# Altium schematic symbol library Schlib.SchLib: 725 symbols (part 1 of 6) (continued)
## 43025-0400 (continued)

## 47053-1000
designator J?  (value not drawn)
CONN HEADER VERT 4POS 2.54MM; Manufacturer: Molex; Manufacturer Part Number: 47053-1000; Number of Contacts: 4; Current Rating: 4A; Voltage Rating: 250V; Gender: Male; Glow Wire Compliant: Non-compliant; Supplier: Rs; Supplier Part Number: 1448185; RoHS: Yes; Category: Headers and Wire Housings; Stock: 1020; Pricing: 10=0.41500, 100=0.38900, 200=0.36400, 250=0.33800, 500=0.31200 (GBP); Mounting Technology: Through Hole; Contact Plating: Tin; Contact Material: Brass,Copper; Housing Color: Beige; Housing Material: Nylon; Min Operating Temperature: 0°C; Max Operating Temperature: 75°C; Termination: Through Hole; Number of Rows: 1; Packaging: Bulk; Package Quantity: 12000; Number of Positions: 4; Orientation: Vertical; Voltage Rating (DC): 250V; Number of Circuits: 4; Series: 47053; Length: 10.2mm; Pitch: 2.54mm; Depth: 5.84mm; Radiation Hardening: No; RoHS Compliant: Yes; Halogen Free: Low Halogen; ComponentLink1URL: https://datasheet.ciiva.com/22683/1701278-22683428.pdf?src-supplier=Element14; ComponentLink1Description: https://datasheet.ciiva.com/22683/1701278-22683428.pdf?src-supplier=Element14; ComponentLink2URL: https://datasheet.ciiva.com/30226/191140470531000-pcb-headers-30226282.pdf?src-supplier=Onlinecomponents.com; ComponentLink2Description: https://datasheet.ciiva.com/30226/191140470531000-pcb-headers-30226282.pdf?src-supplier=Onlinecomponents.com; ComponentLink3URL: https://datasheet.ciiva.com/5153/0470531000-pcb-headers-146351-5153461.pdf?src-supplier=Mouser; ComponentLink3Description: https://datasheet.ciiva.com/5153/0470531000-pcb-headers-146351-5153461.pdf?src-supplier=Mouser; ComponentLink4URL: https://datasheet.ciiva.com/10090/0470531000-pcb-headers-10090525.pdf?src-supplier=Avnet; ComponentLink4Description: https://datasheet.ciiva.com/10090/0470531000-pcb-headers-10090525.pdf?src-supplier=Avnet
footprint 47053-1000
pins: 1, 2, 3, 4

## 52435-2271
designator J?  (value not drawn)
Conn FFC/FPC Connector SKT 22 POS 0.5mm Solder RA SMD Easy-On™ T/R; Manufacturer: Molex; Manufacturer Part Number: 52435-2271; Supplier: Mouser; Supplier Part Number: 538-52435-2271; RoHS: Yes; Category: FFC / FPC; Stock: 4465; Pricing: 1=1.19, 10=1.19, 50=1.19, 100=1.19, 1000=1.19, 10000=1.19 (USD); ComponentLink1URL: https://datasheet.ciiva.com/16120/407840524352271-ffc-fpc-nectors-16120305.pdf?src-supplier=Onlinecomponents.com; ComponentLink1Description: https://datasheet.ciiva.com/16120/407840524352271-ffc-fpc-nectors-16120305.pdf?src-supplier=Onlinecomponents.com; ComponentLink2URL: https://datasheet.ciiva.com/30091/383140524352271-ffc-fpc-nectors-30091502.pdf?src-supplier=Onlinecomponents.com; ComponentLink2Description: https://datasheet.ciiva.com/30091/383140524352271-ffc-fpc-nectors-30091502.pdf?src-supplier=Onlinecomponents.com; ComponentLink3URL: https://datasheet.ciiva.com/5137/0524352271-ffc-fpc-connectors-170492-5137771.pdf?src-supplier=Mouser; ComponentLink3Description: https://datasheet.ciiva.com/5137/0524352271-ffc-fpc-connectors-170492-5137771.pdf?src-supplier=Mouser; ComponentLink4URL: https://datasheet.ciiva.com/16659/0524352271-ffc-fpc-connectors-16659956.pdf?; ComponentLink4Description: https://datasheet.ciiva.com/16659/0524352271-ffc-fpc-connectors-16659956.pdf?; ComponentLink5URL: https://datasheet.ciiva.com/10366/0524352271-ffc-fpc-connectors-10366757.pdf?src-supplier=Avnet; ComponentLink5Description: https://datasheet.ciiva.com/10366/0524352271-ffc-fpc-connectors-10366757.pdf?src-supplier=Avnet
footprint 524352271
pins: 1, 2, 3, 4, 5, 6, 7, 8, 9, 10, 11, 12, 13, 14, 15, 16, 17, 18, 19, 20, 21, 22, MP1, MP2, MP3, MP4

## 52559-2253
designator *
FFC / FPC Board Connector, 0.5 mm, 22 Contacts, Receptacle, Easy-On 52559 Series, Surface Mount; Manufacturer: Molex; Manufacturer Part Number: 52559-2253; Manufacturer Lifecycle Status: ACTIVE; Actuator Material: Polyphenylene; Contact Resistance: 20mΩ; Current Rating: 500mA; Dielectric Material: Polyamide; Insulation Resistance: 50MΩ; Number of Circuits: 22; Pitch: 1mm; Plating: Tin; Plating Thickness: 101.6nm; Voltage Rating: 50V; Wire/Cable Type: Straight; Supplier: Arrow Electronics; Supplier Part Number: 0525592253; RoHS: Compliant; Category: Card Edge Connectors; Stock: 6000; Pricing: 1000=1.6023, 2000=1.52, 3000=1.468, 5000=1.408 (USD); China RoHS: Compliant; Contact Gender: Female; Contact Material: Bronze; Contact Plating: Gold; Country of Origin: MY; Depth: 3mm; Flammability Rating: UL94 V-0; Housing Color: Natural; Housing Material: Nylon; Length: 16.7mm; Lifecycle Status: Production; Max Operating Temperature: 85°C; Min Operating Temperature: -20°C; Mounting Technology: Surface Mount; Number of Contacts: 22; Pins: 22; Number of Positions: 22; Number of Rows: 1; Orientation: Vertical; Radiation Hardening: No; REACH SVHC: Yes; Schedule B: 8536694040, 8536694040|8536694040, 8536694040|8536694040|8536694040, 8536694040|8536694040|8536694040|8536694040; Terminal Pitch: 500µm; Termination: Solder; ComponentLink1URL: https://datasheet.octopart.com:443/52559-2253-Molex-datasheet-164834097.pdf?src-supplier=Farnell; ComponentLink1Description: https://datasheet.octopart.com:443/52559-2253-Molex-datasheet-164834097.pdf?src-supplier=Farnell; ComponentLink2URL: https://datasheet.octopart.com:443/52559-2253-Molex-datasheet-13777103.pdf?src-supplier=Molex; ComponentLink2Description: https://datasheet.octopart.com:443/52559-2253-Molex-datasheet-13777103.pdf?src-supplier=Molex; ComponentLink3URL: https://sigma.octopart.com:443/32997597/technical_drawing/Molex-525592253.pdf?src-supplier=Molex; ComponentLink3Description: https://sigma.octopart.com:443/32997597/technical_drawing/Molex-525592253.pdf?src-supplier=Molex; ComponentLink4URL: https://datasheet.octopart.com:443/52559-2253-Molex-datasheet-140186331.pdf?src-supplier=RS+(Formerly+Allied+Electronics); ComponentLink4Description: https://datasheet.octopart.com:443/52559-2253-Molex-datasheet-140186331.pdf?src-supplier=RS+(Formerly+Allied+Electronics); ComponentLink5URL: https://datasheet.octopart.com:443/52559-2253-Molex-datasheet-120153440.pdf?src-supplier=RS+(Formerly+Allied+Electronics); ComponentLink5Description: https://datasheet.octopart.com:443/52559-2253-Molex-datasheet-120153440.pdf?src-supplier=RS+(Formerly+Allied+Electronics); ComponentLink6URL: https://datasheet.octopart.com:443/0525592253-Molex-datasheet-11736640.pdf?src-supplier=Arrow+Electronics; ComponentLink6Description: https://datasheet.octopart.com:443/0525592253-Molex-datasheet-11736640.pdf?src-supplier=Arrow+Electronics; ComponentLink7URL: http://sigma.octopart.com:80/32997640/rohs_statement/Molex-525592253.pdf?src-supplier=Compliance+Statements; ComponentLink7Description: http://sigma.octopart.com:80/32997640/rohs_statement/Molex-525592253.pdf?src-supplier=Compliance+Statements; ComponentLink8URL: http://sigma.octopart.com:80/conflict_mineral_statement/Molex-company-72.pdf?src-supplier=Compliance+Statements; ComponentLink8Description: http://sigma.octopart.com:80/conflict_mineral_statement/Molex-company-72.pdf?src-supplier=Compliance+Statements; ComponentLink9URL: http://sigma.octopart.com:80/rohs_statement/Molex-company-73.pdf?src-supplier=Compliance+Statements; ComponentLink9Description: http://sigma.octopart.com:80/rohs_statement/Molex-company-73.pdf?src-supplier=Compliance+Statements; ComponentLink10URL: http://sigma.octopart.com:80/reach_statement/Molex-company-74.pdf?src-supplier=Compliance+Statements; ComponentLink10Description: http://sigma.octopart.com:80/reach_statement/Molex-company-74.pdf?src-supplier=Compliance+Statements
pins: 1, 2, 3, 4, 5, 6, 7, 8, 9, 10, 11, 12, 13, 14, 15, 16, 17, 18, 19, 20, 21, 22, MP1, MP2, MP3, MP4

## 53047-0210
designator J?  (value not drawn)
PicoBlade 53047 2-Position Shrouded Header Male Blade 0.049" (1.25mm) Natural Through Hole; Manufacturer: Molex; Manufacturer Part Number: 53047-0210; Body Plating: Tin; Plating: 154ConductorMaterial; Contact Resistance: 20mR; Current Rating: 1A; Voltage Rating: 125V; Number of Poles: 2; Max Current Rating: 3A; Insulation Resistance: 100MR; Glow Wire Compliant: Non-compliant; Supplier: Mouser; Supplier Part Number: 538-53047-0210; RoHS: Yes; Category: Headers and Wire Housings; Stock: 27749; Pricing: 1=0.17, 10=0.111, 50=0.111, 100=0.094, 1000=0.088, 10000=0.075 (USD); Mounting Technology: Through Hole; Contact Plating: Tin,Gold; Contact Material: Bronze,Brass,Tin; Housing Color: Black; Color: Natural; Housing Material: Polyamide; Min Operating Temperature: -40°C; Max Operating Temperature: 85°C; Number of Rows: 1; Voltage Rating (AC): 125V; Packaging: Tray; Package Quantity: 5000; Number of Positions: 2; Termination: Solder; Number of Contacts: 2; Working Voltage: 125V; Orientation: Vertical; Gender: Male; Number of Circuits: 2; Series: PicoBlade; Length: 71.1mm; Height: 11.43mm; Lead Pitch: 1.25mm; Pitch: 1.25mm; Depth: 6.6mm; Radiation Hardening: No; Lead Free: Lead Free; Flammability Rating: UL94 V-0; RoHS Compliant: Yes; Reach SVHC Compliant: Unknown
footprint 0530470210
pins: 1, 2

## 54548-2272
designator *
Cross Referenced to MOLEX - Part MOL0545482272; Manufacturer Part Number: 54548-2272; Supplier: Mouser; Supplier Part Number: 538-54548-2272; Manufacturer: Molex; RoHS: No; Category: Connectors; Stock: 17751; Pricing: 1=3.46, 10=3.04, 50=3.04, 100=2.42, 1000=2, 10000=1.87 (USD)
pins: 1, 2, 3, 4, 5, 6, 7, 8, 9, 10, 11, 12, 13, 14, 15, 16, 17, 18, 19, 20, 21, 22, MP1, MP2, MP3, MP4

## 55917-0810
designator J?  (value not drawn)
2.00mm Pitch MicroClasp Wire-to-Board Header, Dual Row, Vertical, 8 Circuits, with PCB Locator; Manufacturer: Molex; Manufacturer Part Number: 55917-0810; Manufacturer Lifecycle Status: ACTIVE; Contact Resistance: 20mΩ; Current Rating: 300mA; Gender: Male; Glow Wire Compliant: Non-compliant; Insulation Resistance: 1GΩ; Max Current Rating: 3A; Max Voltage Rating (DC): 250.25kV; Number of Circuits: 8; Operating Force: 4.8928N; Pitch: 2mm; Plating: Tin; Row Spacing: 5.0038mm; Voltage Rating: 250V; Supplier: RS; Supplier Part Number: 406449; RoHS: Compliant; Category: Headers and Wire Housings; Stock: 910; Pricing: 10=0.37 (GBP); Ambient Temperature Range High: 105°C; China RoHS: Compliant; Color: Natural, White; Contact Gender: Male; Contact Material: Brass; Contact Plating: Tin; Country of Origin: VN; Flammability Rating: UL94 V-0; Height: 9.95mm; Housing Material: Polyester; Lead Pitch: 2mm; Lifecycle Status: Production; Material: Glass, Polyester; Max Operating Temperature: 85°C; Min Operating Temperature: -25°C; Mounting Technology: Through Hole; Number of Contacts: 8; Pins: 8; Number of Poles: 8; Number of Positions: 8; Number of Rows: 2; Orientation: Vertical; Packaging: Bulk; REACH SVHC: Yes; Schedule B: 8536694040, 8536694040|8536694040|8536694040|8536694040|8536694040|8536694040|8536694040|8536694040|8536694040|8536694040|8536694040|8536694040|8536694040|8536694040|8536694040|8536694040|8536694040|8536694040|8536694040|8536694040|8536694040|8536694040|8536694040|85; Terminal Pitch: 2mm; Termination: Solder; Voltage Rating (AC): 250V; Voltage Rating (DC): 250V; Working Voltage: 250V; ComponentLink1URL: https://sigma.octopart.com:443/164493888/technical_drawing/Molex-55917-0810.pdf?src-supplier=IHS; ComponentLink1Description: https://sigma.octopart.com:443/164493888/technical_drawing/Molex-55917-0810.pdf?src-supplier=IHS; ComponentLink2URL: https://datasheet.octopart.com:443/55917-0810-Molex-datasheet-164493884.pdf?src-supplier=Upverter; ComponentLink2Description: https://datasheet.octopart.com:443/55917-0810-Molex-datasheet-164493884.pdf?src-supplier=Upverter; ComponentLink3URL: https://datasheet.octopart.com:443/55917-0810-Molex-datasheet-16420540.pdf?src-supplier=Sager+Electronics; ComponentLink3Description: https://datasheet.octopart.com:443/55917-0810-Molex-datasheet-16420540.pdf?src-supplier=Sager+Electronics; ComponentLink4URL: https://datasheet.octopart.com:443/0559170810-Molex-datasheet-158457239.pdf?src-supplier=Sager+Electronics; ComponentLink4Description: https://datasheet.octopart.com:443/0559170810-Molex-datasheet-158457239.pdf?src-supplier=Sager+Electronics; ComponentLink5URL: https://sigma.octopart.com:443/11018036/technical_drawing/Molex-55917-0810.pdf?src-supplier=Molex; ComponentLink5Description: https://sigma.octopart.com:443/11018036/technical_drawing/Molex-55917-0810.pdf?src-supplier=Molex; ComponentLink6URL: https://datasheet.octopart.com:443/559170810-Molex-datasheet-8341728.pdf?src-supplier=Molex; ComponentLink6Description: https://datasheet.octopart.com:443/559170810-Molex-datasheet-8341728.pdf?src-supplier=Molex; ComponentLink7URL: https://datasheet.octopart.com:443/55917-0810-Molex-datasheet-154756755.pdf?src-supplier=Master+Electronics; ComponentLink7Description: https://datasheet.octopart.com:443/55917-0810-Molex-datasheet-154756755.pdf?src-supplier=Master+Electronics; ComponentLink8URL: https://datasheet.octopart.com:443/55917-0810-Molex-datasheet-41568811.pdf?src-supplier=Electro+Sonic; ComponentLink8Description: https://datasheet.octopart.com:443/55917-0810-Molex-datasheet-41568811.pdf?src-supplier=Electro+Sonic; ComponentLink9URL: https://datasheet.octopart.com:443/55917-0810-Molex-datasheet-37171827.pdf?src-supplier=Electro+Sonic; ComponentLink9Description: https://datasheet.octopart.com:443/55917-0810-Molex-datasheet-37171827.pdf?src-supplier=Electro+Sonic; ComponentLink10URL: https://datasheet.octopart.com:443/55917-0810-Molex-datasheet-23710648.pdf?src-supplier=Electro+Sonic; ComponentLink10Description: https://datasheet.octopart.com:443/55917-0810-Molex-datasheet-23710648.pdf?src-supplier=Electro+Sonic; ComponentLink11URL: https://datasheet.octopart.com:443/55917-0810-Molex-datasheet-168217160.pdf?src-supplier=TME; ComponentLink11Description: https://datasheet.octopart.com:443/55917-0810-Molex-datasheet-168217160.pdf?src-supplier=TME; ComponentLink12URL: https://datasheet.octopart.com:443/55917-0810-Molex-datasheet-140186835.pdf?src-supplier=RS+(Formerly+Allied+Electronics); ComponentLink12Description: https://datasheet.octopart.com:443/55917-0810-Molex-datasheet-140186835.pdf?src-supplier=RS+(Formerly+Allied+Electronics); ComponentLink13URL: https://datasheet.octopart.com:443/55917-0810-Molex-datasheet-120154482.pdf?src-supplier=RS+(Formerly+Allied+Electronics); ComponentLink13Description: https://datasheet.octopart.com:443/55917-0810-Molex-datasheet-120154482.pdf?src-supplier=RS+(Formerly+Allied+Electronics); ComponentLink14URL: https://datasheet.octopart.com:443/55917-0810-Molex-datasheet-112141758.pdf?src-supplier=Newark; ComponentLink14Description: https://datasheet.octopart.com:443/55917-0810-Molex-datasheet-112141758.pdf?src-supplier=Newark; ComponentLink15URL: https://datasheet.octopart.com:443/55917-0810-Molex-datasheet-77523450.pdf?src-supplier=Newark; ComponentLink15Description: https://datasheet.octopart.com:443/55917-0810-Molex-datasheet-77523450.pdf?src-supplier=Newark; ComponentLink16URL: https://datasheet.octopart.com:443/55917-0810-Molex-datasheet-33003963.pdf?src-supplier=Newark; ComponentLink16Description: https://datasheet.octopart.com:443/55917-0810-Molex-datasheet-33003963.pdf?src-supplier=Newark; ComponentLink17URL: https://datasheet.octopart.com:443/55917-0810-Molex-datasheet-27773.pdf?src-supplier=Newark; ComponentLink17Description: https://datasheet.octopart.com:443/55917-0810-Molex-datasheet-27773.pdf?src-supplier=Newark; ComponentLink18URL: https://datasheet.octopart.com:443/55917-0810-Molex-datasheet-167409.pdf?src-supplier=Mouser; ComponentLink18Description: https://datasheet.octopart.com:443/55917-0810-Molex-datasheet-167409.pdf?src-supplier=Mouser; ComponentLink19URL: https://datasheet.octopart.com:443/559170810-Molex-datasheet-506651.pdf?src-supplier=Farnell; ComponentLink19Description: https://datasheet.octopart.com:443/559170810-Molex-datasheet-506651.pdf?src-supplier=Farnell; ComponentLink20URL: http://sigma.octopart.com:80/16420541/rohs_statement/Molex-55917-0810.pdf?src-supplier=Compliance+Statements; ComponentLink20Description: http://sigma.octopart.com:80/16420541/rohs_statement/Molex-55917-0810.pdf?src-supplier=Compliance+Statements; ComponentLink21URL: http://sigma.octopart.com:80/conflict_mineral_statement/Molex-company-72.pdf?src-supplier=Compliance+Statements; ComponentLink21Description: http://sigma.octopart.com:80/conflict_mineral_statement/Molex-company-72.pdf?src-supplier=Compliance+Statements; ComponentLink22URL: http://sigma.octopart.com:80/rohs_statement/Molex-company-73.pdf?src-supplier=Compliance+Statements; ComponentLink22Description: http://sigma.octopart.com:80/rohs_statement/Molex-company-73.pdf?src-supplier=Compliance+Statements; ComponentLink23URL: http://sigma.octopart.com:80/reach_statement/Molex-company-74.pdf?src-supplier=Compliance+Statements; ComponentLink23Description: http://sigma.octopart.com:80/reach_statement/Molex-company-74.pdf?src-supplier=Compliance+Statements
footprint 0559170810
pins: 1, 2, 3, 4, 5, 6, 7, 8

## 55917-1010
designator J?  (value not drawn)
2.00mm Pitch MicroClasp Wire-to-Board Header, Dual Row, Vertical, 10 Circuits, with PCB Locator; Manufacturer: Molex; Manufacturer Part Number: 55917-1010; Manufacturer Lifecycle Status: ACTIVE; Contact Resistance: 20mΩ; Current Rating: 3A; Gender: Male; Glow Wire Compliant: Non-compliant; Insulation Resistance: 1GΩ; Max Voltage Rating (DC): 250.25kV; Number of Circuits: 8; Number of Contacts: 10; Operating Force: 4.448N; Pitch: 2mm; Plating: Tin; Row Spacing: 5.0038mm; Voltage Rating: 250V; Supplier: RS; Supplier Part Number: 406439P; RoHS: Compliant; Category: Headers and Wire Housings; Stock: 2313; Pricing: 10=0.249 (GBP); China RoHS: Compliant; Color: Natural, White; Contact Gender: Male; Contact Material: Nickel, Tin; Contact Plating: Tin; Country of Origin: VN; Flammability Rating: UL94 V-0; Height: 9.95mm; Housing Material: Polyester; Lead Pitch: 2mm; Lifecycle Status: Production; Material: Glass, Polyester; Max Current Rating: 3A; Max Operating Temperature: 85°C; Min Operating Temperature: -25°C; Mounting Technology: Through Hole; Pins: 10; Number of Poles: 10; Number of Positions: 10; Number of Rows: 2; Orientation: Vertical; Packaging: Bulk; Radiation Hardening: No; REACH SVHC: Yes; Terminal Pitch: 2mm; Termination: Solder; Voltage Rating (AC): 250V; Voltage Rating (DC): 250V; Working Voltage: 250V; ComponentLink1URL: https://datasheet.octopart.com:443/55917-1010-Molex-datasheet-163792276.pdf?src-supplier=Upverter; ComponentLink1Description: https://datasheet.octopart.com:443/55917-1010-Molex-datasheet-163792276.pdf?src-supplier=Upverter; ComponentLink2URL: https://sigma.octopart.com:443/163792277/technical_drawing/Molex-55917-1010.pdf?src-supplier=Upverter; ComponentLink2Description: https://sigma.octopart.com:443/163792277/technical_drawing/Molex-55917-1010.pdf?src-supplier=Upverter; ComponentLink3URL: https://datasheet.octopart.com:443/55917-1010-Molex-datasheet-180777589.pdf?src-supplier=IHS; ComponentLink3Description: https://datasheet.octopart.com:443/55917-1010-Molex-datasheet-180777589.pdf?src-supplier=IHS; ComponentLink4URL: https://datasheet.octopart.com:443/55917-1010-Molex-datasheet-16420545.pdf?src-supplier=Sager+Electronics; ComponentLink4Description: https://datasheet.octopart.com:443/55917-1010-Molex-datasheet-16420545.pdf?src-supplier=Sager+Electronics; ComponentLink5URL: https://datasheet.octopart.com:443/0559171010-Molex-datasheet-157440134.pdf?src-supplier=Sager+Electronics; ComponentLink5Description: https://datasheet.octopart.com:443/0559171010-Molex-datasheet-157440134.pdf?src-supplier=Sager+Electronics; ComponentLink6URL: https://sigma.octopart.com:443/11018036/technical_drawing/Molex-55917-1010.pdf?src-supplier=Molex; ComponentLink6Description: https://sigma.octopart.com:443/11018036/technical_drawing/Molex-55917-1010.pdf?src-supplier=Molex; ComponentLink7URL: https://datasheet.octopart.com:443/559171010-Molex-datasheet-8341728.pdf?src-supplier=Molex; ComponentLink7Description: https://datasheet.octopart.com:443/559171010-Molex-datasheet-8341728.pdf?src-supplier=Molex; ComponentLink8URL: https://datasheet.octopart.com:443/55917-1010-Molex-datasheet-154756756.pdf?src-supplier=Master+Electronics; ComponentLink8Description: https://datasheet.octopart.com:443/55917-1010-Molex-datasheet-154756756.pdf?src-supplier=Master+Electronics; ComponentLink9URL: https://datasheet.octopart.com:443/55917-1010-Molex-datasheet-168217161.pdf?src-supplier=TME; ComponentLink9Description: https://datasheet.octopart.com:443/55917-1010-Molex-datasheet-168217161.pdf?src-supplier=TME; ComponentLink10URL: https://datasheet.octopart.com:443/55917-1010-Molex-datasheet-140186836.pdf?src-supplier=RS+(Formerly+Allied+Electronics); ComponentLink10Description: https://datasheet.octopart.com:443/55917-1010-Molex-datasheet-140186836.pdf?src-supplier=RS+(Formerly+Allied+Electronics); ComponentLink11URL: https://datasheet.octopart.com:443/55917-1010-Molex-datasheet-120154483.pdf?src-supplier=RS+(Formerly+Allied+Electronics); ComponentLink11Description: https://datasheet.octopart.com:443/55917-1010-Molex-datasheet-120154483.pdf?src-supplier=RS+(Formerly+Allied+Electronics); ComponentLink12URL: https://datasheet.octopart.com:443/55917-1010-Molex-datasheet-77521366.pdf?src-supplier=Newark; ComponentLink12Description: https://datasheet.octopart.com:443/55917-1010-Molex-datasheet-77521366.pdf?src-supplier=Newark; ComponentLink13URL: https://datasheet.octopart.com:443/55917-1010-Molex-datasheet-33003964.pdf?src-supplier=Newark; ComponentLink13Description: https://datasheet.octopart.com:443/55917-1010-Molex-datasheet-33003964.pdf?src-supplier=Newark; ComponentLink14URL: https://datasheet.octopart.com:443/55917-1010-Molex-datasheet-27773.pdf?src-supplier=Newark; ComponentLink14Description: https://datasheet.octopart.com:443/55917-1010-Molex-datasheet-27773.pdf?src-supplier=Newark; ComponentLink15URL: https://datasheet.octopart.com:443/55917-1010-Molex-datasheet-62335430.pdf?src-supplier=Electro+Sonic; ComponentLink15Description: https://datasheet.octopart.com:443/55917-1010-Molex-datasheet-62335430.pdf?src-supplier=Electro+Sonic; ComponentLink16URL: https://datasheet.octopart.com:443/55917-1010-Molex-datasheet-37171828.pdf?src-supplier=Electro+Sonic; ComponentLink16Description: https://datasheet.octopart.com:443/55917-1010-Molex-datasheet-37171828.pdf?src-supplier=Electro+Sonic; ComponentLink17URL: https://datasheet.octopart.com:443/55917-1010-Molex-datasheet-23710649.pdf?src-supplier=Electro+Sonic; ComponentLink17Description: https://datasheet.octopart.com:443/55917-1010-Molex-datasheet-23710649.pdf?src-supplier=Electro+Sonic; ComponentLink18URL: https://datasheet.octopart.com:443/0559171010-Molex-datasheet-11836776.pdf?src-supplier=Arrow+Electronics; ComponentLink18Description: https://datasheet.octopart.com:443/0559171010-Molex-datasheet-11836776.pdf?src-supplier=Arrow+Electronics; ComponentLink19URL: https://datasheet.octopart.com:443/55917-1010-Molex-datasheet-5313627.pdf?src-supplier=Verical; ComponentLink19Description: https://datasheet.octopart.com:443/55917-1010-Molex-datasheet-5313627.pdf?src-supplier=Verical; ComponentLink20URL: https://datasheet.octopart.com:443/55917-1010-Molex-datasheet-165648.pdf?src-supplier=Mouser; ComponentLink20Description: https://datasheet.octopart.com:443/55917-1010-Molex-datasheet-165648.pdf?src-supplier=Mouser; ComponentLink21URL: https://datasheet.octopart.com:443/559171010-Molex-datasheet-506651.pdf?src-supplier=Farnell; ComponentLink21Description: https://datasheet.octopart.com:443/559171010-Molex-datasheet-506651.pdf?src-supplier=Farnell; ComponentLink22URL: http://sigma.octopart.com:80/16420546/rohs_statement/Molex-55917-1010.pdf?src-supplier=Compliance+Statements; ComponentLink22Description: http://sigma.octopart.com:80/16420546/rohs_statement/Molex-55917-1010.pdf?src-supplier=Compliance+Statements; ComponentLink23URL: http://sigma.octopart.com:80/conflict_mineral_statement/Molex-company-72.pdf?src-supplier=Compliance+Statements; ComponentLink23Description: http://sigma.octopart.com:80/conflict_mineral_statement/Molex-company-72.pdf?src-supplier=Compliance+Statements; ComponentLink24URL: http://sigma.octopart.com:80/rohs_statement/Molex-company-73.pdf?src-supplier=Compliance+Statements; ComponentLink24Description: http://sigma.octopart.com:80/rohs_statement/Molex-company-73.pdf?src-supplier=Compliance+Statements; ComponentLink25URL: http://sigma.octopart.com:80/reach_statement/Molex-company-74.pdf?src-supplier=Compliance+Statements; ComponentLink25Description: http://sigma.octopart.com:80/reach_statement/Molex-company-74.pdf?src-supplier=Compliance+Statements
footprint 0559171010
pins: 1, 2, 3, 4, 5, 6, 7, 8, 9, 10

## 55917-1210
designator J?  (value not drawn)
2.00mm Pitch MicroClasp Wire-to-Board Header, Dual Row, Vertical, 12 Circuits, with PCB Locator; Manufacturer: Molex; Manufacturer Part Number: 55917-1210; Manufacturer Lifecycle Status: ACTIVE; Contact Resistance: 20mΩ; Current Rating: 3A; Gender: Male; Glow Wire Compliant: Non-compliant; Insulation Resistance: 1GΩ; Max Voltage Rating (DC): 250.25kV; Number of Circuits: 10; Number of Contacts: 12; Operating Force: 3.8086N; Pitch: 2mm; Plating: Tin; Row Spacing: 5.0038mm; Voltage Rating: 250V; Supplier: Farnell; Supplier Part Number: 4238257; RoHS: Compliant; Category: Headers and Wire Housings; Stock: 15136; Pricing: 300=0.435, 900=0.366 (GBP); China RoHS: Compliant; Color: Natural, White; Contact Gender: Male; Contact Material: Brass; Contact Plating: Tin; Country of Origin: VN; Flammability Rating: UL94 V-0; Housing Material: Polyester; Lead Pitch: 2mm; Lifecycle Status: Production; Material: Glass, Polyester; Max Current Rating: 3A; Max Operating Temperature: 85°C; Min Operating Temperature: -25°C; Mounting Technology: Through Hole; Pins: 12; Number of Poles: 12; Number of Positions: 12; Number of Rows: 2; Orientation: Vertical; Packaging: Bulk; Radiation Hardening: No; REACH SVHC: Yes; Schedule B: 8536694040, 8536694040|8536694040|8536694040|8536694040|8536694040|8536694040|8536694040|8536694040|8536694040|8536694040|8536694040|8536694040|8536694040|8536694040|8536694040|8536694040|8536694040|8536694040|8536694040|8536694040|8536694040|8536694040|8536694040|85; Terminal Pitch: 2mm; Termination: Solder; Voltage Rating (AC): 250V; Voltage Rating (DC): 250V; Working Voltage: 250V; ComponentLink1URL: https://datasheet.octopart.com:443/55917-1210-Molex-datasheet-163792277.pdf?src-supplier=Newark; ComponentLink1Description: https://datasheet.octopart.com:443/55917-1210-Molex-datasheet-163792277.pdf?src-supplier=Newark; ComponentLink2URL: https://datasheet.octopart.com:443/55917-1210-Molex-datasheet-101583478.pdf?src-supplier=Newark; ComponentLink2Description: https://datasheet.octopart.com:443/55917-1210-Molex-datasheet-101583478.pdf?src-supplier=Newark; ComponentLink3URL: https://datasheet.octopart.com:443/55917-1210-Molex-datasheet-43881499.pdf?src-supplier=Newark; ComponentLink3Description: https://datasheet.octopart.com:443/55917-1210-Molex-datasheet-43881499.pdf?src-supplier=Newark; ComponentLink4URL: https://datasheet.octopart.com:443/55917-1210-Molex-datasheet-21208821.pdf?src-supplier=Newark; ComponentLink4Description: https://datasheet.octopart.com:443/55917-1210-Molex-datasheet-21208821.pdf?src-supplier=Newark; ComponentLink5URL: https://datasheet.octopart.com:443/55917-1210-Molex-datasheet-27773.pdf?src-supplier=Newark; ComponentLink5Description: https://datasheet.octopart.com:443/55917-1210-Molex-datasheet-27773.pdf?src-supplier=Newark; ComponentLink6URL: https://datasheet.octopart.com:443/55917-1210-Molex-datasheet-13790080.pdf?src-supplier=Molex; ComponentLink6Description: https://datasheet.octopart.com:443/55917-1210-Molex-datasheet-13790080.pdf?src-supplier=Molex; ComponentLink7URL: https://sigma.octopart.com:443/11018036/technical_drawing/Molex-55917-1210.pdf?src-supplier=Molex; ComponentLink7Description: https://sigma.octopart.com:443/11018036/technical_drawing/Molex-55917-1210.pdf?src-supplier=Molex; ComponentLink8URL: https://datasheet.octopart.com:443/559171210-Molex-datasheet-8352696.pdf?src-supplier=Molex; ComponentLink8Description: https://datasheet.octopart.com:443/559171210-Molex-datasheet-8352696.pdf?src-supplier=Molex; ComponentLink9URL: https://datasheet.octopart.com:443/55917-1210-Molex-datasheet-154756758.pdf?src-supplier=Master+Electronics; ComponentLink9Description: https://datasheet.octopart.com:443/55917-1210-Molex-datasheet-154756758.pdf?src-supplier=Master+Electronics; ComponentLink10URL: https://datasheet.octopart.com:443/55917-1210-Molex-datasheet-33003965.pdf?src-supplier=Electro+Sonic; ComponentLink10Description: https://datasheet.octopart.com:443/55917-1210-Molex-datasheet-33003965.pdf?src-supplier=Electro+Sonic; ComponentLink11URL: https://datasheet.octopart.com:443/55917-1210-Molex-datasheet-62105546.pdf?src-supplier=Electro+Sonic; ComponentLink11Description: https://datasheet.octopart.com:443/55917-1210-Molex-datasheet-62105546.pdf?src-supplier=Electro+Sonic; ComponentLink12URL: https://datasheet.octopart.com:443/55917-1210-Molex-datasheet-27887869.pdf?src-supplier=Electro+Sonic; ComponentLink12Description: https://datasheet.octopart.com:443/55917-1210-Molex-datasheet-27887869.pdf?src-supplier=Electro+Sonic; ComponentLink13URL: https://datasheet.octopart.com:443/55917-1210-Molex-datasheet-140186838.pdf?src-supplier=RS+(Formerly+Allied+Electronics); ComponentLink13Description: https://datasheet.octopart.com:443/55917-1210-Molex-datasheet-140186838.pdf?src-supplier=RS+(Formerly+Allied+Electronics); ComponentLink14URL: https://datasheet.octopart.com:443/55917-1210-Molex-datasheet-120154485.pdf?src-supplier=RS+(Formerly+Allied+Electronics); ComponentLink14Description: https://datasheet.octopart.com:443/55917-1210-Molex-datasheet-120154485.pdf?src-supplier=RS+(Formerly+Allied+Electronics); ComponentLink15URL: https://datasheet.octopart.com:443/0559171210-Molex-datasheet-11736572.pdf?src-supplier=Arrow+Electronics; ComponentLink15Description: https://datasheet.octopart.com:443/0559171210-Molex-datasheet-11736572.pdf?src-supplier=Arrow+Electronics; ComponentLink16URL: https://datasheet.octopart.com:443/55917-1210-Molex-datasheet-166188.pdf?src-supplier=Mouser; ComponentLink16Description: https://datasheet.octopart.com:443/55917-1210-Molex-datasheet-166188.pdf?src-supplier=Mouser; ComponentLink17URL: https://datasheet.octopart.com:443/559171210-Molex-datasheet-506651.pdf?src-supplier=Farnell; ComponentLink17Description: https://datasheet.octopart.com:443/559171210-Molex-datasheet-506651.pdf?src-supplier=Farnell; ComponentLink18URL: http://sigma.octopart.com:80/16420549/rohs_statement/Molex-55917-1210.pdf?src-supplier=Compliance+Statements; ComponentLink18Description: http://sigma.octopart.com:80/16420549/rohs_statement/Molex-55917-1210.pdf?src-supplier=Compliance+Statements; ComponentLink19URL: http://sigma.octopart.com:80/conflict_mineral_statement/Molex-company-72.pdf?src-supplier=Compliance+Statements; ComponentLink19Description: http://sigma.octopart.com:80/conflict_mineral_statement/Molex-company-72.pdf?src-supplier=Compliance+Statements; ComponentLink20URL: http://sigma.octopart.com:80/rohs_statement/Molex-company-73.pdf?src-supplier=Compliance+Statements; ComponentLink20Description: http://sigma.octopart.com:80/rohs_statement/Molex-company-73.pdf?src-supplier=Compliance+Statements; ComponentLink21URL: http://sigma.octopart.com:80/reach_statement/Molex-company-74.pdf?src-supplier=Compliance+Statements; ComponentLink21Description: http://sigma.octopart.com:80/reach_statement/Molex-company-74.pdf?src-supplier=Compliance+Statements
footprint 0559171210
pins: 1, 2, 3, 4, 5, 6, 7, 8, 9, 10, 11, 12

## 55917-1410
designator J?  (value not drawn)
2.00mm Pitch MicroClasp Wire-to-Board Header, Dual Row, Vertical, 14 Circuits, with PCB Locator; Manufacturer: Molex; Manufacturer Part Number: 55917-1410; Manufacturer Lifecycle Status: ACTIVE; Contact Resistance: 20mΩ; Current Rating: 3A; Gender: Male; Glow Wire Compliant: Non-compliant; Insulation Resistance: 1GΩ; Max Voltage Rating (DC): 250.25kV; Number of Circuits: 12; Number of Contacts: 14; Operating Force: 3.4472N; Pitch: 2mm; Plating: Tin; Row Spacing: 5.0038mm; Voltage Rating: 250V; Supplier: RS; Supplier Part Number: 406445P; RoHS: Compliant; Category: Headers and Wire Housings; Stock: 3520; Pricing: 10=0.336 (GBP); China RoHS: Compliant; Color: White; Contact Gender: Male; Contact Material: Brass; Contact Plating: Tin; Country of Origin: VN; Flammability Rating: UL94 V-0; Housing Material: Polyester; Lead Pitch: 2mm; Lifecycle Status: Production; Material: Glass, Polyester; Max Current Rating: 3A; Max Operating Temperature: 85°C; Min Operating Temperature: -25°C; Mounting Technology: Through Hole; Pins: 14; Number of Poles: 14; Number of Positions: 14; Number of Rows: 2; Orientation: Vertical; Radiation Hardening: No; REACH SVHC: Yes; Schedule B: 8536694040, 8536694040|8536694040|8536694040|8536694040|8536694040|8536694040|8536694040|8536694040|8536694040|8536694040|8536694040|8536694040|8536694040|8536694040|8536694040|8536694040|8536694040|8536694040|8536694040|8536694040|8536694040|8536694040|8536694040|85; Terminal Pitch: 2mm; Termination: Solder; Voltage Rating (AC): 250V; Voltage Rating (DC): 250V; Working Voltage: 250V; ComponentLink1URL: https://datasheet.octopart.com:443/55917-1410-Molex-datasheet-164493888.pdf?src-supplier=IHS; ComponentLink1Description: https://datasheet.octopart.com:443/55917-1410-Molex-datasheet-164493888.pdf?src-supplier=IHS; ComponentLink2URL: https://datasheet.octopart.com:443/55917-1410-Molex-datasheet-16420555.pdf?src-supplier=Sager+Electronics; ComponentLink2Description: https://datasheet.octopart.com:443/55917-1410-Molex-datasheet-16420555.pdf?src-supplier=Sager+Electronics; ComponentLink3URL: https://datasheet.octopart.com:443/0559171410-Molex-datasheet-159670791.pdf?src-supplier=Sager+Electronics; ComponentLink3Description: https://datasheet.octopart.com:443/0559171410-Molex-datasheet-159670791.pdf?src-supplier=Sager+Electronics; ComponentLink4URL: https://sigma.octopart.com:443/11018036/technical_drawing/Molex-55917-1410.pdf?src-supplier=Molex; ComponentLink4Description: https://sigma.octopart.com:443/11018036/technical_drawing/Molex-55917-1410.pdf?src-supplier=Molex; ComponentLink5URL: https://datasheet.octopart.com:443/559171410-Molex-datasheet-8348638.pdf?src-supplier=Molex; ComponentLink5Description: https://datasheet.octopart.com:443/559171410-Molex-datasheet-8348638.pdf?src-supplier=Molex; ComponentLink6URL: https://datasheet.octopart.com:443/55917-1410-Molex-datasheet-154756759.pdf?src-supplier=Master+Electronics; ComponentLink6Description: https://datasheet.octopart.com:443/55917-1410-Molex-datasheet-154756759.pdf?src-supplier=Master+Electronics; ComponentLink7URL: https://datasheet.octopart.com:443/55917-1410-Molex-datasheet-168217163.pdf?src-supplier=TME; ComponentLink7Description: https://datasheet.octopart.com:443/55917-1410-Molex-datasheet-168217163.pdf?src-supplier=TME; ComponentLink8URL: https://datasheet.octopart.com:443/55917-1410-Molex-datasheet-140186839.pdf?src-supplier=RS+(Formerly+Allied+Electronics); ComponentLink8Description: https://datasheet.octopart.com:443/55917-1410-Molex-datasheet-140186839.pdf?src-supplier=RS+(Formerly+Allied+Electronics); ComponentLink9URL: https://datasheet.octopart.com:443/55917-1410-Molex-datasheet-120154486.pdf?src-supplier=RS+(Formerly+Allied+Electronics); ComponentLink9Description: https://datasheet.octopart.com:443/55917-1410-Molex-datasheet-120154486.pdf?src-supplier=RS+(Formerly+Allied+Electronics); ComponentLink10URL: https://datasheet.octopart.com:443/55917-1410-Molex-datasheet-77521367.pdf?src-supplier=Newark; ComponentLink10Description: https://datasheet.octopart.com:443/55917-1410-Molex-datasheet-77521367.pdf?src-supplier=Newark; ComponentLink11URL: https://datasheet.octopart.com:443/55917-1410-Molex-datasheet-33003966.pdf?src-supplier=Newark; ComponentLink11Description: https://datasheet.octopart.com:443/55917-1410-Molex-datasheet-33003966.pdf?src-supplier=Newark; ComponentLink12URL: https://datasheet.octopart.com:443/55917-1410-Molex-datasheet-27773.pdf?src-supplier=Newark; ComponentLink12Description: https://datasheet.octopart.com:443/55917-1410-Molex-datasheet-27773.pdf?src-supplier=Newark; ComponentLink13URL: https://datasheet.octopart.com:443/55917-1410-Molex-datasheet-62105547.pdf?src-supplier=Electro+Sonic; ComponentLink13Description: https://datasheet.octopart.com:443/55917-1410-Molex-datasheet-62105547.pdf?src-supplier=Electro+Sonic; ComponentLink14URL: https://datasheet.octopart.com:443/55917-1410-Molex-datasheet-37171829.pdf?src-supplier=Electro+Sonic; ComponentLink14Description: https://datasheet.octopart.com:443/55917-1410-Molex-datasheet-37171829.pdf?src-supplier=Electro+Sonic; ComponentLink15URL: https://datasheet.octopart.com:443/55917-1410-Molex-datasheet-23710650.pdf?src-supplier=Electro+Sonic; ComponentLink15Description: https://datasheet.octopart.com:443/55917-1410-Molex-datasheet-23710650.pdf?src-supplier=Electro+Sonic; ComponentLink16URL: https://datasheet.octopart.com:443/559171410-Molex-datasheet-506651.pdf?src-supplier=Farnell; ComponentLink16Description: https://datasheet.octopart.com:443/559171410-Molex-datasheet-506651.pdf?src-supplier=Farnell; ComponentLink17URL: http://sigma.octopart.com:80/16420557/rohs_statement/Molex-55917-1410.pdf?src-supplier=Compliance+Statements; ComponentLink17Description: http://sigma.octopart.com:80/16420557/rohs_statement/Molex-55917-1410.pdf?src-supplier=Compliance+Statements; ComponentLink18URL: http://sigma.octopart.com:80/conflict_mineral_statement/Molex-company-72.pdf?src-supplier=Compliance+Statements; ComponentLink18Description: http://sigma.octopart.com:80/conflict_mineral_statement/Molex-company-72.pdf?src-supplier=Compliance+Statements; ComponentLink19URL: http://sigma.octopart.com:80/rohs_statement/Molex-company-73.pdf?src-supplier=Compliance+Statements; ComponentLink19Description: http://sigma.octopart.com:80/rohs_statement/Molex-company-73.pdf?src-supplier=Compliance+Statements; ComponentLink20URL: http://sigma.octopart.com:80/reach_statement/Molex-company-74.pdf?src-supplier=Compliance+Statements; ComponentLink20Description: http://sigma.octopart.com:80/reach_statement/Molex-company-74.pdf?src-supplier=Compliance+Statements
footprint 0559171410
pins: 1, 2, 3, 4, 5, 6, 7, 8, 9, 10, 11, 12, 13, 14

## 83614-9012
designator J?  (value not drawn)
Conn Commercial Micro-D PIN 25 POS 1.27mm Solder RA Thru-Hole 25 Terminal 1 Port Tube; Manufacturer: Molex; Manufacturer Part Number: 83614-9012; Plating: Nickel,Steel; Gender: Male; Current Rating: 1A; Voltage Rating (AC): 350V; Number of Positions: 25; Number of Ports: 1; Shielding: Shielded; Insulation Resistance: 5GR; Supplier: Mouser; Supplier Part Number: 538-83614-9012; RoHS: Yes; Category: D-Sub Connectors; Stock: 919; Pricing: 1=22.05, 10=17.66, 50=17.66, 100=17.66, 1000=15.05, 10000=15.05 (USD); Mounting Technology: Through Hole; Contact Material: Copper,Copper Alloy; Contact Plating: Gold; Shell Material: Steel; Color: Black; Shell Size: B; Min Operating Temperature: -40°C; Max Operating Temperature: 125°C; Termination: Solder; Orientation: Right Angle; Number of Rows: 2; Packaging: Rail/Tube; Package Quantity: 102; Max Voltage Rating (AC): 350V; Number of Contacts: 25; Number of Circuits: 25; Series: 83614; Pitch: 1.27mm; Halogen Free: Low Halogen; ELV: Compliant; RoHS Compliant: Yes; ComponentLink1URL: https://datasheet.ciiva.com/5116/836149012-sd-133119-5116592.pdf?src-supplier=Mouser; ComponentLink1Description: https://datasheet.ciiva.com/5116/836149012-sd-133119-5116592.pdf?src-supplier=Mouser; ComponentLink2URL: https://datasheet.ciiva.com/16137/780750836149012-io-nectors-16137456.pdf?src-supplier=Onlinecomponents.com; ComponentLink2Description: https://datasheet.ciiva.com/16137/780750836149012-io-nectors-16137456.pdf?src-supplier=Onlinecomponents.com; ComponentLink3URL: https://datasheet.ciiva.com/30080/38230836149012-io-nectors-30080784.pdf?src-supplier=Onlinecomponents.com; ComponentLink3Description: https://datasheet.ciiva.com/30080/38230836149012-io-nectors-30080784.pdf?src-supplier=Onlinecomponents.com; ComponentLink4URL: https://datasheet.ciiva.com/10035/0836149012-io-connectors-10035738.pdf?src-supplier=Avnet; ComponentLink4Description: https://datasheet.ciiva.com/10035/0836149012-io-connectors-10035738.pdf?src-supplier=Avnet
footprint 83614-9012
pins: 1, 2, 3, 4, 5, 6, 7, 8, 9, 10, 11, 12, 13, 14, 15, 16, 17, 18, 19, 20, 21, 22, 23, 24, 25, MH1, MH2

## 0467005.NR
designator F?
Electric Fuse, Very Fast Blow, 5A, 32VAC, 32VDC, 35A (IR), Surface Mount, 0603; Manufacturer: Littelfuse; Manufacturer Part Number: 0467005.NR; Approvals: CSA, UL; Power Dissipation: 306mW; Value: 8.9mΩ; Time to Trip: 14.4ks; Voltage Rating (AC): 32V; Supplier: Arrow Electronics; Supplier Part Number: 0467005.NR; RoHS: Compliant; Category: Fuses; Stock: 5000; Pricing: 5000=0.5605 (USD); Case/Package: 0603; Case Code (Imperial): 0603; Case Code (Metric): 1608; Composition: Thin Film; Country of Origin: Philippines; Current Rating: 5A; Depth: 810µm; Export Control Classification Number (ECCN) Code: EAR99; Fuse Current: 5A; Height: 305µm; Harmonized Tariff Schedule (HTS) Code: 8536.10.00.40; Introduction Date: 2005-04-01; Lead Free: Lead Free; Length: 1.6mm; Lifecycle Status: Production; Max Operating Temperature: 90°C; Min Operating Temperature: -55°C; Mounting Technology: Surface Mount; Pins: 2; Packaging: Tape and Reel; Radiation Hardening: No; REACH SVHC: No; Voltage Rating (DC): 32V; Width: 813µm; Working Voltage: 32V; ComponentLink1URL: https://datasheet.octopart.com:443/0467005.NR-Littelfuse-datasheet-32023482.pdf?src-supplier=Newark; ComponentLink1Description: https://datasheet.octopart.com:443/0467005.NR-Littelfuse-datasheet-32023482.pdf?src-supplier=Newark; ComponentLink2URL: https://datasheet.octopart.com:443/0467005.NR-Littelfuse-datasheet-11722264.pdf?src-supplier=Newark; ComponentLink2Description: https://datasheet.octopart.com:443/0467005.NR-Littelfuse-datasheet-11722264.pdf?src-supplier=Newark; ComponentLink3URL: https://datasheet.octopart.com:443/0467005.NR-Littelfuse-datasheet-5389844.pdf?src-supplier=Newark; ComponentLink3Description: https://datasheet.octopart.com:443/0467005.NR-Littelfuse-datasheet-5389844.pdf?src-supplier=Newark; ComponentLink4URL: https://datasheet.octopart.com:443/0467005.NR-Littelfuse-datasheet-534620.pdf?src-supplier=Newark; ComponentLink4Description: https://datasheet.octopart.com:443/0467005.NR-Littelfuse-datasheet-534620.pdf?src-supplier=Newark; ComponentLink5URL: https://datasheet.octopart.com:443/0467005.NR-Littelfuse-datasheet-8360650.pdf?src-supplier=element14+APAC; ComponentLink5Description: https://datasheet.octopart.com:443/0467005.NR-Littelfuse-datasheet-8360650.pdf?src-supplier=element14+APAC; ComponentLink6URL: https://datasheet.octopart.com:443/0467005.NR-Littelfuse-datasheet-110733733.pdf?src-supplier=element14+APAC; ComponentLink6Description: https://datasheet.octopart.com:443/0467005.NR-Littelfuse-datasheet-110733733.pdf?src-supplier=element14+APAC; ComponentLink7URL: https://datasheet.octopart.com:443/0467005.NR-Littelfuse-datasheet-178296323.pdf?src-supplier=Burklin+Elektronik; ComponentLink7Description: https://datasheet.octopart.com:443/0467005.NR-Littelfuse-datasheet-178296323.pdf?src-supplier=Burklin+Elektronik; ComponentLink8URL: https://datasheet.octopart.com:443/0467005.NR-Littelfuse-datasheet-170674136.pdf?src-supplier=Future+Electronics; ComponentLink8Description: https://datasheet.octopart.com:443/0467005.NR-Littelfuse-datasheet-170674136.pdf?src-supplier=Future+Electronics; ComponentLink9URL: https://datasheet.octopart.com:443/0467005.NR-Littelfuse-datasheet-183003506.pdf?src-supplier=Sager+Electronics; ComponentLink9Description: https://datasheet.octopart.com:443/0467005.NR-Littelfuse-datasheet-183003506.pdf?src-supplier=Sager+Electronics; ComponentLink10URL: https://datasheet.octopart.com:443/0467005.NR-Littelfuse-datasheet-184785031.pdf?src-supplier=Sager+Electronics; ComponentLink10Description: https://datasheet.octopart.com:443/0467005.NR-Littelfuse-datasheet-184785031.pdf?src-supplier=Sager+Electronics; ComponentLink11URL: https://datasheet.octopart.com:443/0467005.NR-Littelfuse-datasheet-136509808.pdf?src-supplier=Littelfuse+SCT; ComponentLink11Description: https://datasheet.octopart.com:443/0467005.NR-Littelfuse-datasheet-136509808.pdf?src-supplier=Littelfuse+SCT; ComponentLink12URL: https://datasheet.octopart.com:443/0467005.NR-Littelfuse-datasheet-14726.pdf?src-supplier=DigiKey; ComponentLink12Description: https://datasheet.octopart.com:443/0467005.NR-Littelfuse-datasheet-14726.pdf?src-supplier=DigiKey
footprint ESD_PGB1010603MR
pins: 1, 2

## 0501010.WR
designator FUSE?  Current: 10A  (hidden comment: *)
Fuse Chip Fast Acting 10A 32V SMD Solder Pad 1206 Ceramic T/R CSA/UL; Manufacturer: Littelfuse; Manufacturer Part Number: 0501010.WR; Supplier: Future Electronics; Supplier Part Number: 4004140; RoHS: Yes; Category: Fuses; Stock: 45000; Pricing: 3000=0.435, 6000=0.425, 9000=0.415 (USD); ComponentLink1URL: https://datasheet.ciiva.com/16327/littelfuse-fuse-501-series-16327360.pdf?src-supplier=Future+Electronics; ComponentLink1Description: https://datasheet.ciiva.com/16327/littelfuse-fuse-501-series-16327360.pdf?src-supplier=Future+Electronics; ComponentLink2URL: https://datasheet.ciiva.com/299/littelfuse-fuse-501-series-299384.pdf?src-supplier=Digikey; ComponentLink2Description: https://datasheet.ciiva.com/299/littelfuse-fuse-501-series-299384.pdf?src-supplier=Digikey; ComponentLink3URL: https://datasheet.ciiva.com/299/littelfuse-fuse-501-series-299385.pdf?src-supplier=Digikey; ComponentLink3Description: https://datasheet.ciiva.com/299/littelfuse-fuse-501-series-299385.pdf?src-supplier=Digikey; ComponentLink4URL: https://datasheet.ciiva.com/299/littelfuse-fuse-501-series-299386.pdf?src-supplier=Digikey; ComponentLink4Description: https://datasheet.ciiva.com/299/littelfuse-fuse-501-series-299386.pdf?src-supplier=Digikey
footprint 0501010.WR
pins: 1, 2

## 501571-2007
designator J?  (value not drawn)
Conn Shrouded Header (4 Sides) HDR 20 POS 1mm Solder RA Side Entry SMD Pico-Clasp™ T/R; Manufacturer: Molex; Manufacturer Part Number: 501571-2007; Manufacturer Lifecycle Status: ACTIVE; Connector Type: Male Pin; Contact Resistance: 20mΩ; Current Rating: 1A; Dielectric Material: Polyamide; Gender: Male; Glow Wire Compliant: Non-compliant; Insulation Resistance: 100MΩ; Max Voltage Rating (AC): 50V; Number of Circuits: 15; Number of Contacts: 20; Operating Force: 1.4734N; Plating: Gold; Plating Thickness: 101.6nm; Row Spacing: 5.6896mm; Voltage Rating: 100V; Supplier: RS; Supplier Part Number: 188692P; RoHS: Compliant; Category: Headers and Wire Housings; Stock: 520; Pricing: 10=1.282 (GBP); China RoHS: Compliant; Color: Natural; Contact Gender: Male; Contact Material: Gold; Contact Plating: Gold; Country of Origin: MY; Depth: 6.5mm; Fastening Type: Latch; Height: 8.45mm; Housing Color: Natural; Housing Material: Thermoplastic; Lead Free: Lead Free; Length: 13mm; Lifecycle Status: Production; Max Operating Temperature: 85°C; Max Voltage Rating (DC): 50V; Min Operating Temperature: -40°C; Mounting Technology: Surface Mount; Pins: 20; Number of Positions: 20; Number of Rows: 1; Orientation: Right Angle; Packaging: Cut Tape; Pitch: 1mm; Radiation Hardening: No; REACH SVHC: Yes; Schedule B: 8536694040, 8536694040|8536694040|8536694040|8536694040|8536694040|8536694040|8536694040|8536694040|8536694040|8536694040|8536694040|8536694040|8536694040|8536694040|8536694040|8536694040|8536694040|8536694040|8536694040|8536694040|8536694040|8536694040|8536694040|85; Terminal Pitch: 1mm; Termination: Solder; Voltage Rating (AC): 50V; ComponentLink1URL: https://datasheet.octopart.com:443/501571-2007-Molex-datasheet-158174133.pdf?src-supplier=Upverter; ComponentLink1Description: https://datasheet.octopart.com:443/501571-2007-Molex-datasheet-158174133.pdf?src-supplier=Upverter; ComponentLink2URL: https://sigma.octopart.com:443/158174134/technical_drawing/Molex-501571-2007.pdf?src-supplier=Upverter; ComponentLink2Description: https://sigma.octopart.com:443/158174134/technical_drawing/Molex-501571-2007.pdf?src-supplier=Upverter; ComponentLink3URL: https://datasheet.octopart.com:443/501571-2007-Molex-datasheet-180774508.pdf?src-supplier=IHS; ComponentLink3Description: https://datasheet.octopart.com:443/501571-2007-Molex-datasheet-180774508.pdf?src-supplier=IHS; ComponentLink4URL: https://sigma.octopart.com:443/16404195/technical_drawing/Molex-501571-2007.pdf?src-supplier=Molex; ComponentLink4Description: https://sigma.octopart.com:443/16404195/technical_drawing/Molex-501571-2007.pdf?src-supplier=Molex; ComponentLink5URL: https://datasheet.octopart.com:443/5015712007-Molex-datasheet-8338316.pdf?src-supplier=Molex; ComponentLink5Description: https://datasheet.octopart.com:443/5015712007-Molex-datasheet-8338316.pdf?src-supplier=Molex; ComponentLink6URL: https://datasheet.octopart.com:443/501571-2007-Molex-datasheet-13786543.pdf?src-supplier=Sager+Electronics; ComponentLink6Description: https://datasheet.octopart.com:443/501571-2007-Molex-datasheet-13786543.pdf?src-supplier=Sager+Electronics; ComponentLink7URL: https://datasheet.octopart.com:443/501571-2007-Molex-datasheet-77520880.pdf?src-supplier=Farnell; ComponentLink7Description: https://datasheet.octopart.com:443/501571-2007-Molex-datasheet-77520880.pdf?src-supplier=Farnell; ComponentLink8URL: https://datasheet.octopart.com:443/501571-2007-Molex-datasheet-16078520.pdf?src-supplier=element14+APAC; ComponentLink8Description: https://datasheet.octopart.com:443/501571-2007-Molex-datasheet-16078520.pdf?src-supplier=element14+APAC; ComponentLink9URL: https://datasheet.octopart.com:443/501571-2007-Molex-datasheet-66628400.pdf?src-supplier=element14+APAC; ComponentLink9Description: https://datasheet.octopart.com:443/501571-2007-Molex-datasheet-66628400.pdf?src-supplier=element14+APAC; ComponentLink10URL: https://datasheet.octopart.com:443/501571-2007-Molex-datasheet-154752664.pdf?src-supplier=Master+Electronics; ComponentLink10Description: https://datasheet.octopart.com:443/501571-2007-Molex-datasheet-154752664.pdf?src-supplier=Master+Electronics; ComponentLink11URL: https://datasheet.octopart.com:443/501571-2007-Molex-datasheet-140185506.pdf?src-supplier=RS+(Formerly+Allied+Electronics); ComponentLink11Description: https://datasheet.octopart.com:443/501571-2007-Molex-datasheet-140185506.pdf?src-supplier=RS+(Formerly+Allied+Electronics); ComponentLink12URL: https://datasheet.octopart.com:443/501571-2007-Molex-datasheet-120151811.pdf?src-supplier=RS+(Formerly+Allied+Electronics); ComponentLink12Description: https://datasheet.octopart.com:443/501571-2007-Molex-datasheet-120151811.pdf?src-supplier=RS+(Formerly+Allied+Electronics); ComponentLink13URL: https://datasheet.octopart.com:443/501571-2007-Molex-datasheet-120074138.pdf?src-supplier=TME; ComponentLink13Description: https://datasheet.octopart.com:443/501571-2007-Molex-datasheet-120074138.pdf?src-supplier=TME; ComponentLink14URL: https://datasheet.octopart.com:443/5015712007-Molex-datasheet-137316104.pdf?src-supplier=Future+Electronics; ComponentLink14Description: https://datasheet.octopart.com:443/5015712007-Molex-datasheet-137316104.pdf?src-supplier=Future+Electronics; ComponentLink15URL: https://datasheet.octopart.com:443/501571-2007-Molex-datasheet-23710301.pdf?src-supplier=Electro+Sonic; ComponentLink15Description: https://datasheet.octopart.com:443/501571-2007-Molex-datasheet-23710301.pdf?src-supplier=Electro+Sonic; ComponentLink16URL: https://datasheet.octopart.com:443/501571-2007-Molex-datasheet-135048.pdf?src-supplier=DigiKey; ComponentLink16Description: https://datasheet.octopart.com:443/501571-2007-Molex-datasheet-135048.pdf?src-supplier=DigiKey; ComponentLink17URL: https://datasheet.octopart.com:443/501571-2007-Molex-datasheet-17724674.pdf?src-supplier=Factory+Futures; ComponentLink17Description: https://datasheet.octopart.com:443/501571-2007-Molex-datasheet-17724674.pdf?src-supplier=Factory+Futures; ComponentLink18URL: http://sigma.octopart.com:80/16404193/rohs_statement/Molex-501571-2007.pdf?src-supplier=Compliance+Statements; ComponentLink18Description: http://sigma.octopart.com:80/16404193/rohs_statement/Molex-501571-2007.pdf?src-supplier=Compliance+Statements; ComponentLink19URL: http://sigma.octopart.com:80/conflict_mineral_statement/Molex-company-72.pdf?src-supplier=Compliance+Statements; ComponentLink19Description: http://sigma.octopart.com:80/conflict_mineral_statement/Molex-company-72.pdf?src-supplier=Compliance+Statements; ComponentLink20URL: http://sigma.octopart.com:80/rohs_statement/Molex-company-73.pdf?src-supplier=Compliance+Statements; ComponentLink20Description: http://sigma.octopart.com:80/rohs_statement/Molex-company-73.pdf?src-supplier=Compliance+Statements; ComponentLink21URL: http://sigma.octopart.com:80/reach_statement/Molex-company-74.pdf?src-supplier=Compliance+Statements; ComponentLink21Description: http://sigma.octopart.com:80/reach_statement/Molex-company-74.pdf?src-supplier=Compliance+Statements